# Altium footprint library PCB贴片元件封装库.pcblib: 366 footprints (part 15 of 23)
Each footprint in its own frame and in the unit in brackets; x right, y up, seen from the top. Pads: shape width x height; smd on the part's side, far side on the other; paste and mask are expansions set on the pad; w line width, h text height; cw(c..) or ccw(c..) is an arc to the next point about the centre after c.
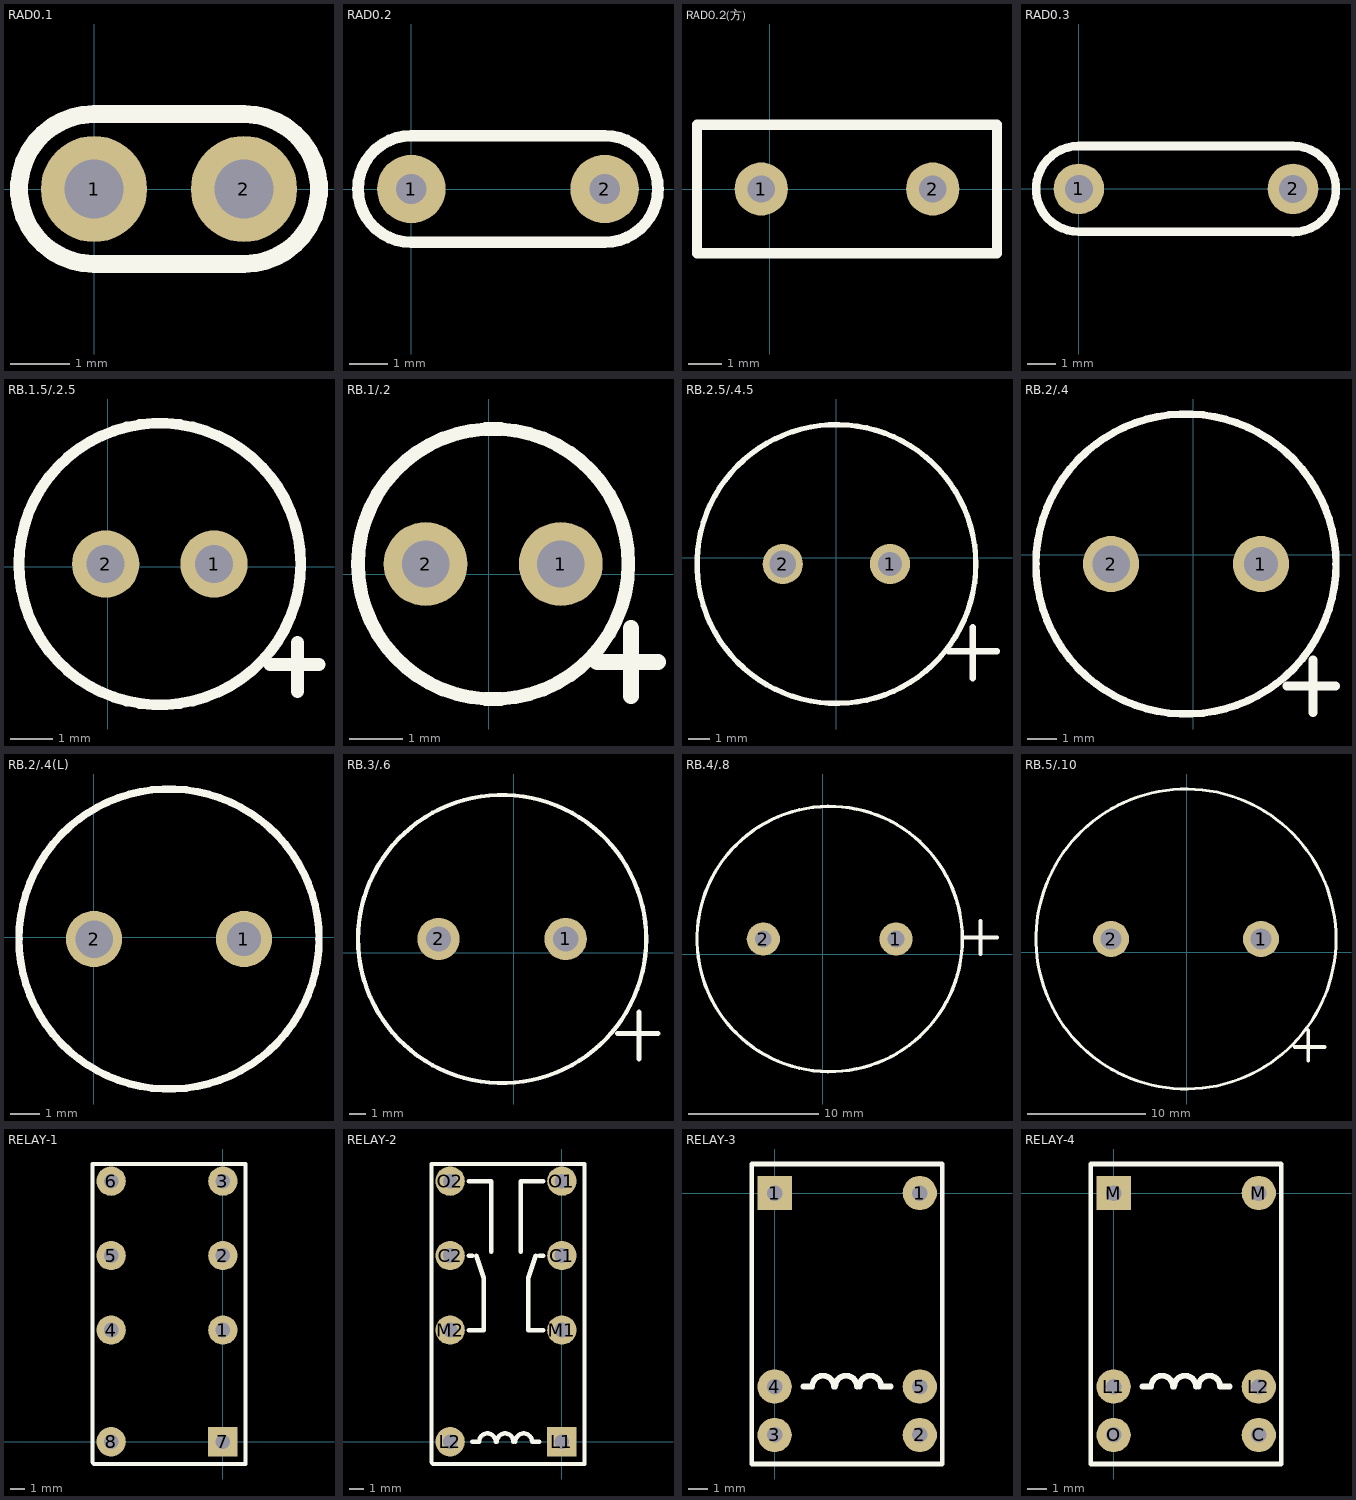
[diagram p14: the footprints below, top view; thin cyan lines are the x and y axes]

## RAD0.1 [mm]
pads (2):
  round 1.8 hole 1: 1(0,0) 2(2.54,0)
TopOverlay:
  lines w0.305: 0,-1.27 cw(c0,0) 0,1.27 2.54,1.27 cw(c2.54,0) 2.54,-1.27 0,-1.27

## RAD0.2 [mm]
pads (2):
  round 1.8 hole 0.8: 1(0,0) 2(5.08,0)
TopOverlay:
  lines w0.305: 0,-1.403 cw(c0,0) 0,1.403 5.08,1.403 cw(c5.08,0) 5.08,-1.403 0,-1.403

## RAD0.2(方) [mil]
pads (2):
  round 62 hole 32: 1(-10,0) 2(190,0)
TopOverlay:
  lines w12: -85,-75 -85,75 265,75 265,-75 -85,-75

## RAD0.3 [mm]
pads (2):
  round 1.8 hole 1: 1(0,0) 2(7.62,0)
TopOverlay:
  lines w0.305: 7.62,-1.536 ccw(c7.62,-0.006) 7.62,1.524 0,1.524 ccw(c0,0) 0,-1.524 7.62,-1.524

## RB.1.5/.2.5 [mil]
pads (2):
  round 62 hole 35: 1(98.11,2.56) 2(-1.89,2.56)
TopOverlay:
  circle w10: c48.11,2.56 r130
  lines w12: 150,-90 195,-90 ; 175,-115 175,-70

## RB.1/.2 [mil]
pads (2):
  round 62 hole 35: 1(53.11,7.56) 2(-46.89,7.56)
TopOverlay:
  circle w10: c3.11,7.56 r100
  lines w12: 80,-65 125,-65 ; 105,-90 105,-40

## RB.2.5/.4.5 [mm]
pads (2):
  round 1.905 hole 1.143: 1(2.555,-0.305)
  round 1.905 hole 1.27: 2(-2.525,-0.305)
TopOverlay:
  circle w0.254: c0.015,-0.305 r6.604
  lines w0.305: 5.334,-4.445 7.62,-4.445 ; 6.477,-5.715 6.477,-3.302

## RB.2/.4 [mm]
pads (2):
  round 1.905 hole 1.143: 1(2.301,-0.305)
  round 1.905 hole 1.27: 2(-2.779,-0.305)
TopOverlay:
  circle w0.254: c-0.239,-0.305 r5.08
  lines w0.305: 3.175,-4.445 4.826,-4.445 ; 4.064,-5.334 4.064,-3.556

## RB.2/.4(L) [mm]
pads (2):
  round 1.905 hole 1.143: 1(5.095,-0.051)
  round 1.905 hole 1.27: 2(0.015,-0.051)
TopOverlay:
  circle w0.254: c2.555,-0.051 r5.08

## RB.3/.6 [mil]
pads (2):
  round 100 hole 60: 1(122.17,32.64) 2(-177.83,32.64)
TopOverlay:
  circle w10: c-27.83,32.64 r340
  lines w12: 245,-190 340,-190 ; 295,-250 295,-140

## RB.4/.8 [mil]
pads (2):
  round 100 hole 50: 1(220.43,45.79) 2(-179.57,45.79)
TopOverlay:
  circle w10: c20.43,45.79 r400
  lines w12: 425,50 525,50 ; 475,0 475,100

## RB.5/.10 [mil]
pads (2):
  round 120 hole 70: 1(246.97,44.88) 2(-253.03,44.88)
TopOverlay:
  circle w10: c-3.03,44.88 r500
  lines w12: 360,-315 460,-315 ; 405,-360 405,-260

## RELAY-1 [mm]
pads (8):
  round 2 hole 1: 1(0,7.62) 2(0,12.7) 3(0,17.78) 4(-7.62,7.62) 5(-7.62,12.7) 6(-7.62,17.78) 8(-7.62,0)
  rect 2x2 hole 1: 7(0,0)
TopOverlay:
  lines w0.3: -8.894,-1.414 -8.894,18.948 1.52,18.948 1.55,18.918 1.55,18.41 1.55,-1.52 -8.45,-1.52 -8.788,-1.52

## RELAY-2 [mm]
pads (8):
  round 2 hole 1: C1(0,12.7) C2(-7.62,12.7) L2(-7.62,0) M1(0,7.62) M2(-7.62,7.62) O1(0,17.78) O2(-7.62,17.78)
  rect 2x2 hole 1: L1(0,0)
TopOverlay:
  lines w0.3: -8.894,-1.414 -8.894,18.948 1.52,18.948 1.55,18.918 1.55,18.41 1.55,-1.52 -8.45,-1.52 -8.788,-1.52
  lines w0.305: -6.35,7.62 -5.334,7.62 -5.334,11.176 -5.842,12.7 ; -6.35,12.7 -6.096,12.7 ; -6.35,17.78 -4.826,17.78 -4.826,12.954 ; -6.096,0 -5.648,0 cw(c-5.08,0) -4.512,0 ; -4.438,0 cw(c-3.87,0) -3.302,0 ; -3.168,0 cw(c-2.6,0) -2.032,0 -1.524,0 ; -2.794,12.954 -2.794,17.78 -1.27,17.78 ; -1.778,12.7 -2.286,11.176 -2.286,7.62 -1.27,7.62 ; -1.524,12.7 -1.27,12.7

## RELAY-3 [mm]
pads (6):
  rect 1.8x1.8 hole 0.813: 1(0,0)
  round 1.8 hole 0.813: 1(7.62,0) 2(7.62,-12.7) 3(0,-12.7) 4(0,-10.16) 5(7.62,-10.16)
TopOverlay:
  lines w0.254: -1.2,-14.224 -1.2,1.524 8.8,1.524 8.8,-14.224 -1.2,-14.224
  lines w0.305: 1.524,-10.16 1.972,-10.16 cw(c2.54,-10.16) 3.108,-10.16 ; 3.182,-10.16 cw(c3.75,-10.16) 4.318,-10.16 ; 4.452,-10.16 cw(c5.02,-10.16) 5.588,-10.16 6.096,-10.16

## RELAY-4 [mm]
pads (6):
  round 1.8 hole 0.813: C(7.62,-12.7) L1(0,-10.16) L2(7.62,-10.16) M(7.62,0) O(0,-12.7)
  rect 1.8x1.8 hole 0.813: M(0,0)
TopOverlay:
  lines w0.254: -1.2,-14.224 -1.2,1.524 8.8,1.524 8.8,-14.224 -1.2,-14.224
  lines w0.305: 1.524,-10.16 1.972,-10.16 cw(c2.54,-10.16) 3.108,-10.16 ; 3.182,-10.16 cw(c3.75,-10.16) 4.318,-10.16 ; 4.452,-10.16 cw(c5.02,-10.16) 5.588,-10.16 6.096,-10.16